# Altium footprint library 电流测试工装板.PcbLib: 36 footprints (part 3 of 3)
Each footprint in its own frame and in the unit in brackets; x right, y up, seen from the top. Pads: shape width x height; smd on the part's side, far side on the other; paste and mask are expansions set on the pad; w line width, h text height; cw(c..) or ccw(c..) is an arc to the next point about the centre after c.
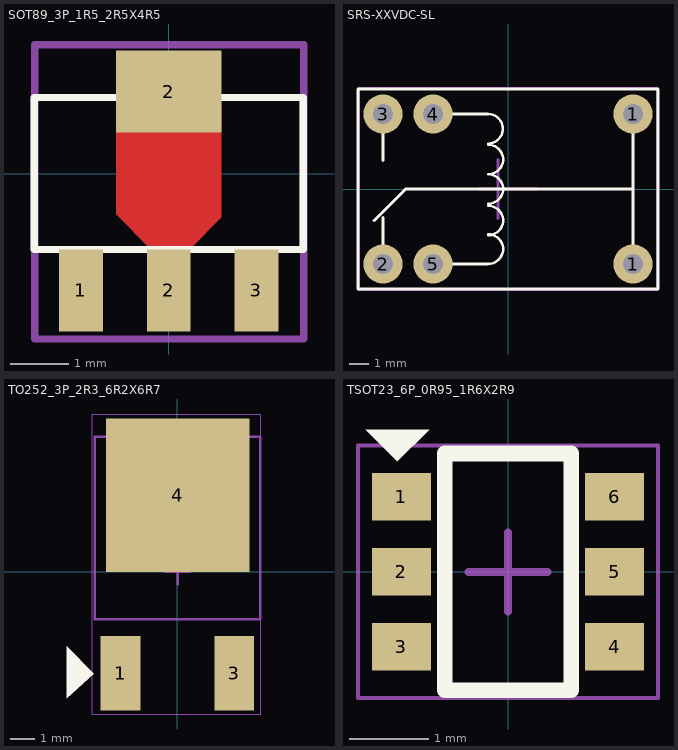
[diagram p2: the footprints below, top view; thin cyan lines are the x and y axes]

## SOT89_3P_1R5_2R5X4R5 [mm]
pads (4):
  rect 0.75x1.4 smd: 1(-1.5,-2) 2(0,-2) 3(1.5,-2)
  rect 1.8x1.4 smd: 2(0,1.4)
Top Layer:
  region: -0.9,1.1 -0.9,-0.7 -0.3,-1.3 0.35,-1.3 0.9,-0.75 0.9,1.2
Top Overlay:
  lines w0.125: -2.3,-1.3 2.3,-1.3 2.3,1.3 -2.3,1.3 -2.3,-1.3
Top Paste:
  region: -0.9,1.1 -0.9,-0.7 -0.3,-1.3 0.35,-1.3 0.9,-0.75 0.9,1.2
Top Solder:
  region: -1,1.094 -1,-0.7 -0.4,-1.3 0.4,-1.3 1,-0.7 1,1.206
Mechanical 13:
  lines w0.125: -2.3,-1.3 -2.3,1.3 2.3,1.3 2.3,-1.3 -2.3,-1.3
Mechanical 15:
  lines w0.125: -2.29,-2.83 -2.29,2.2 2.31,2.2 2.31,-2.83 -2.29,-2.83
3D body "SOT89-3-1.step": height 1.7, standoff 0, extent -2.349,-2.75 2.349,1.7
3D body: height 0.01, standoff 0, extent -2.29,-2.83 2.31,2.1

## SRS-XXVDC-SL [mm]
pads (6):
  round 2 hole 1: 1(6.35,-3.81) 1(6.35,3.81) 2(-6.35,-3.81) 3(-6.35,3.81) 4(-3.81,3.81) 5(-3.81,-3.81)
Top Overlay:
  lines w0.127: -1.01,2.31 ccw(c-1.01,3.06) -1.01,3.81 ; -1,-3.8 ccw(c-1,-3.05) -1,-2.3 ; -1,-2.35 ccw(c-1,-1.6) -1,-0.85 ; -1,-0.75 ccw(c-1,0) -1,0.75 ccw(c-1,1.5) -1,2.25
  lines w0.15: -6.8,-1.6 -5.2,0 6.35,0 ; -6.35,-3.81 -6.35,-1.45 ; -6.35,1.45 -6.35,3.81 ; -3.81,-3.81 -1.01,-3.81 ; -3.81,3.81 -1.01,3.81 ; 6.35,-3.81 6.35,3.81 ; -7.62,-5.08 -7.62,5.08 7.62,5.08 7.62,-5.08 -6.35,-5.08 -7.62,-5.08
Mechanical 13:
  lines w0.15: -7.6,-5.1 -7.6,5.1 7.6,5.1 7.6,-5.1 -7.6,-5.1
Mechanical 15:
  lines w0.15: -1.5,0 1.5,0 ; -0.5,-1.5 -0.5,1.5 ; -7.6,-5.1 7.6,-5.1 7.6,5.1 -7.6,5.1 -7.6,-5.1
3D body: height 12, standoff 0, extent -7.6,-5.1 7.6,5.1
3D body: height 0.01, standoff 0, extent -7.6,-5.1 7.6,5.1

## TO252_3P_2R3_6R2X6R7 [mm]
pads (3):
  rect 1.6x3 smd: 1(-2.3,-4.1) 3(2.3,-4.1)
  rect 5.8x6.2 smd: 4(0.01,3.1)
Top Overlay:
  region: -4.48,-5.12 -4.48,-3.02 -3.38,-4.12
Mechanical 13:
  lines w0.1: -3.34,-1.91 3.35,-1.91 3.35,5.46 -3.34,5.46 -3.34,-1.91
Mechanical 15:
  lines w0.05: -3.45,-5.75 3.37,-5.75 3.37,6.38 -3.45,6.38 -3.45,-5.75
  lines w0.1: -0.49,0 0.51,0 ; 0.01,-0.5 0.01,0.5
3D body "TO252.step": height 2.34, standoff -0.07, extent -3.25,-4.591 3.29,5.348
3D body: height 0.01, standoff 0, extent -3.5,-5.75 3.34,6.535

## TSOT23_6P_0R95_1R6X2R9 [mm]
pads (6):
  rect 0.75x0.6 smd: 1(-1.35,0.95) 2(-1.35,0) 3(-1.35,-0.95) 4(1.35,-0.95) 5(1.35,0) 6(1.35,0.95)
Top Overlay:
  region: -1.4,1.4 -1.8,1.8 -1,1.8
  lines w0.2: -0.8,-1.5 -0.8,1.5 0.8,1.5 0.8,-1.5 -0.8,-1.5
Mechanical 13:
  lines w0.1: -0.85,-1.5 0.85,-1.5 0.85,1.5 -0.85,1.5 -0.85,-1.5
Mechanical 15:
  lines w0.05: -1.9,-1.6 1.9,-1.6 1.9,1.6 -1.9,1.6 -1.9,-1.6
  lines w0.1: -0.5,0 0.5,0 ; 0,-0.5 0,0.5
3D body "TSOT23-6.step": height 1, standoff 0, extent -1.412,-1.45 1.412,1.45
3D body: height 0.1, standoff 0, extent -1.9,-1.6 1.9,1.6